# Altium footprint library 封装库.PcbLib: 755 footprints (part 34 of 48)
Each footprint in its own frame and in the unit in brackets; x right, y up, seen from the top. Pads: shape width x height; smd on the part's side, far side on the other; paste and mask are expansions set on the pad; w line width, h text height; cw(c..) or ccw(c..) is an arc to the next point about the centre after c.
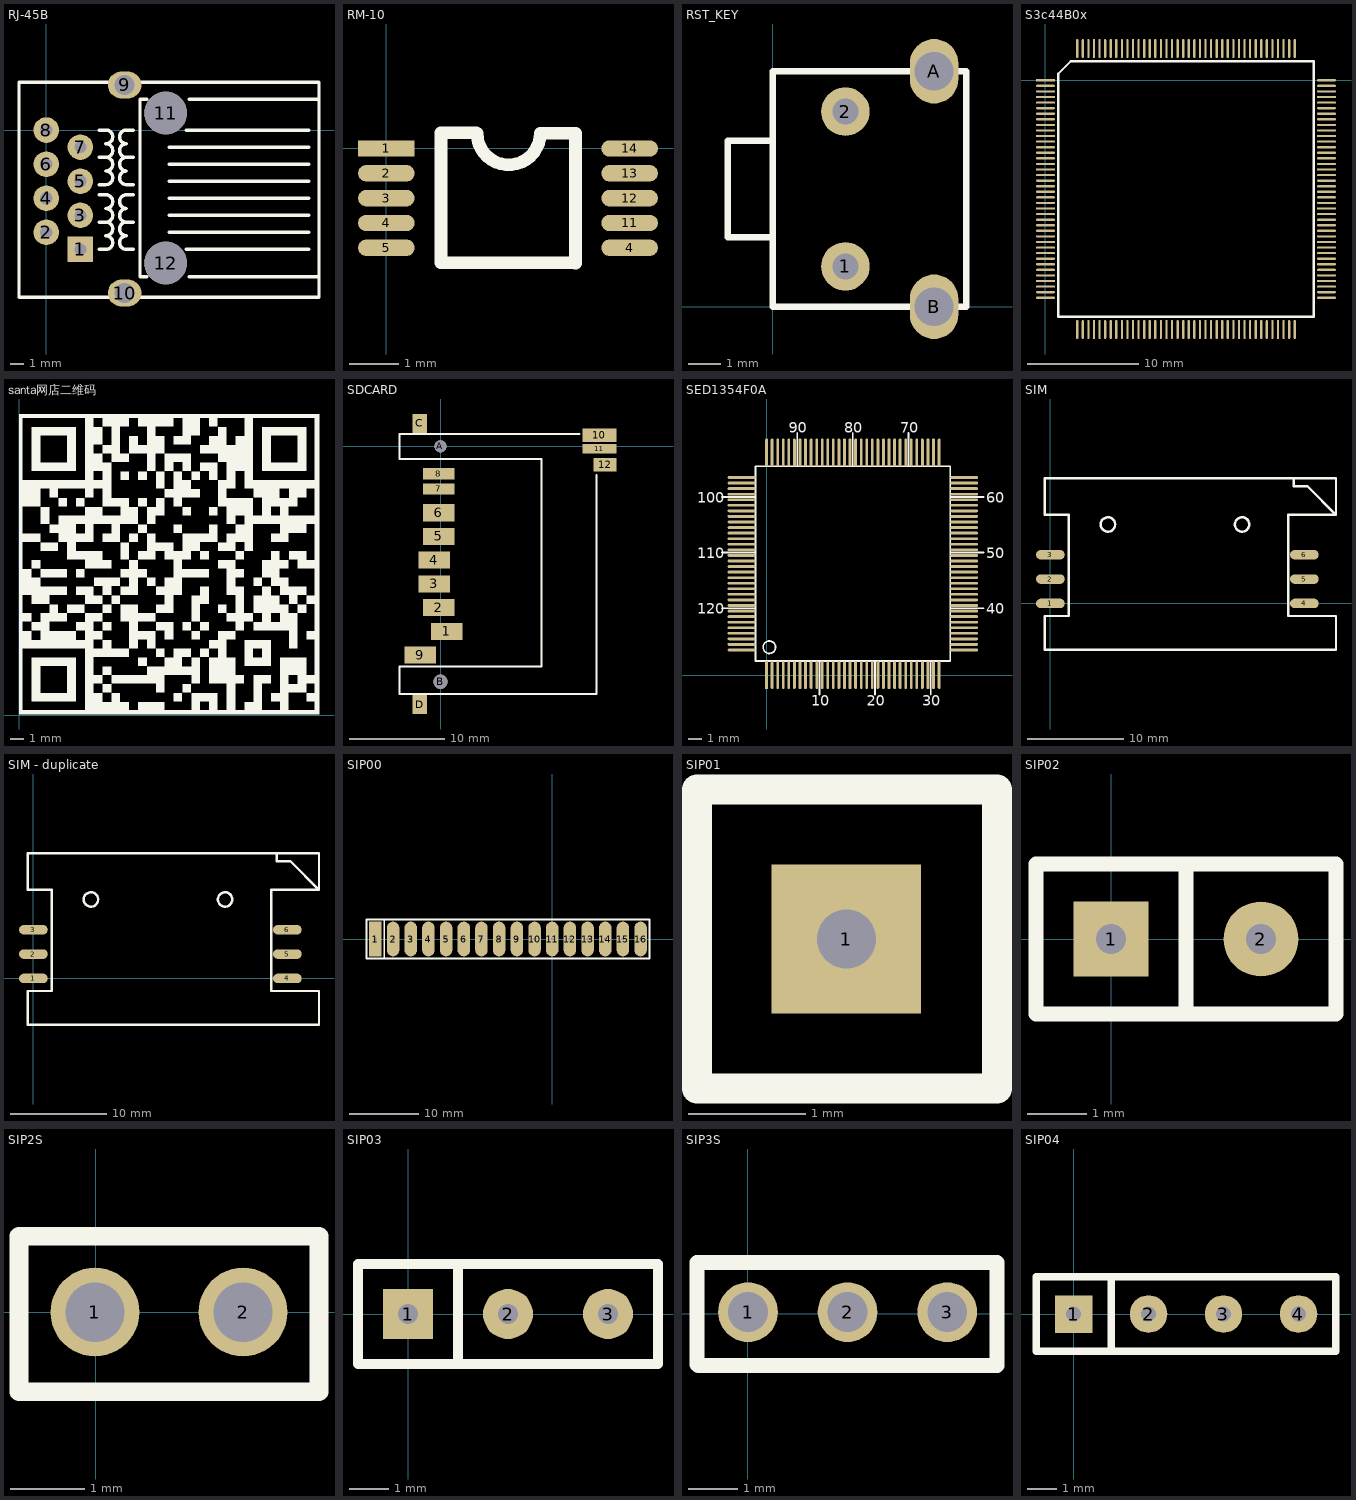
[diagram p33: the footprints below, top view; thin cyan lines are the x and y axes]

## RJ-45B [mm]
pads (12):
  rect 1.905x1.905 hole 0.9: 1(2.54,-8.89)
  round 1.905 hole 0.9: 2(0,-7.62) 3(2.54,-6.35) 4(0,-5.08) 5(2.54,-3.81) 6(0,-2.54) 7(2.54,-1.27) 8(0,0)
  oval 2.5x2 hole 1.5: 9(5.84,3.36) 10(5.84,-12.14)
  round 3.175 hole 3.175: 11(8.89,1.27) 12(8.89,-9.906)
Top Overlay:
  lines w0.254: 3.937,-8.89 4.445,-8.89 ccw(c4.445,-8.382) 4.445,-7.874 ccw(c4.445,-7.366) 4.445,-6.858 ; 3.937,-6.858 4.445,-6.858 ; 3.937,-4.826 4.445,-4.826 cw(c4.445,-5.334) 4.445,-5.842 cw(c4.445,-6.35) 4.445,-6.858 ; 3.937,-4.064 4.445,-4.064 ccw(c4.445,-3.556) 4.445,-3.048 ccw(c4.445,-2.54) 4.445,-2.032 ; 3.937,-2.032 4.445,-2.032 ; 3.937,0 4.445,0 cw(c4.445,-0.508) 4.445,-1.016 cw(c4.445,-1.524) 4.445,-2.032 ; 6.477,-8.89 5.969,-8.89 cw(c5.969,-8.382) 5.969,-7.874 cw(c5.969,-7.366) 5.969,-6.858 ; 6.477,-6.858 5.969,-6.858 ; 6.477,-4.826 5.969,-4.826 ccw(c5.969,-5.334) 5.969,-5.842 ccw(c5.969,-6.35) 5.969,-6.858 ; 6.477,-4.064 5.969,-4.064 cw(c5.969,-3.556) 5.969,-3.048 cw(c5.969,-2.54) 5.969,-2.032 ; 6.477,-2.032 5.969,-2.032 ; 6.477,0 5.969,0 ccw(c5.969,-0.508) 5.969,-1.016 ccw(c5.969,-1.524) 5.969,-2.032 ; 7.493,-10.922 6.985,-10.922 6.985,2.286 7.493,2.286 ; 9.144,-7.62 19.558,-7.62 ; 9.144,-6.35 19.558,-6.35 ; 9.144,-5.08 19.558,-5.08 ; 9.144,-3.81 19.558,-3.81 ; 9.144,-2.54 19.558,-2.54 ; 9.144,-1.27 19.558,-1.27 ; 10.414,-8.89 13.716,-8.89 19.558,-8.89 ; 10.414,0 13.462,0 19.558,0 ; 10.668,-10.922 17.272,-10.922 20.32,-10.922 ; 10.668,2.286 17.272,2.286 20.32,2.286 ; -2.032,-12.446 -2.032,3.556 -1.524,3.556 17.272,3.556 20.32,3.556 20.32,-12.446 17.272,-12.446 -1.524,-12.446 -2.032,-12.446

## RM-10 [mm]
pads (10):
  rect 1.143x0.33 smd: 1(0,0)
  oval 1.143x0.33 smd: 2(0,-0.5) 3(0,-1) 4(0,-1.5) 4(4.9,-2) 5(0,-2) 11(4.9,-1.5) 12(4.9,-1) 13(4.9,-0.5) 14(4.9,0)
Top Overlay:
  lines w0.254: 1.814,0.32 1.1,0.32 1.1,-2.3 3.799,-2.3 ; 1.829,0.305 ccw(c2.464,0.305) 3.099,0.305 3.806,0.305 ; 3.81,-2.311 3.81,0.309

## RST_KEY [mm]
pads (4):
  round 1.5 hole 0.8: 1(2.25,1.25) 2(2.25,6.05)
  oval 1.5x2 hole 1.2: A(5,7.3) B(5,0)
Top Overlay:
  lines w0.2: 0,2.15 -1.4,2.15 -1.4,5.15 0,5.15 ; 0,0 6,0 6,7.3 0,7.3 0,0

## S3c44B0x [mm]
pads (160):
  rect 1.7x0.2 smd: 1(0,0)
  oval 1.7x0.2 smd: 2(0,-0.5) 3(0,-1) 4(0,-1.5) 5(0,-2) 6(0,-2.5) 7(0,-3) 8(0,-3.5) 9(0,-4) 10(0,-4.5) 11(0,-5) 12(0,-5.5) 13(0,-6) 14(0,-6.5) 15(0,-7) 16(0,-7.5) 17(0,-8) 18(0,-8.5) 19(0,-9) 20(0,-9.5) 21(0,-10) 22(0,-10.5) 23(0,-11) 24(0,-11.5) 25(0,-12) 26(0,-12.5) 27(0,-13) 28(0,-13.5) 29(0,-14) 30(0,-14.5) 31(0,-15) 32(0,-15.5) 33(0,-16) 34(0,-16.5) 35(0,-17) 36(0,-17.5) 37(0,-18) 38(0,-18.5) 39(0,-19) 40(0,-19.5) 81(25.2,-19.5) 82(25.2,-19) 83(25.2,-18.5) 84(25.2,-18) 85(25.2,-17.5) 86(25.2,-17) 87(25.2,-16.5) 88(25.2,-16) 89(25.2,-15.5) 90(25.2,-15) 91(25.2,-14.5) 92(25.2,-14) 93(25.2,-13.5) 94(25.2,-13) 95(25.2,-12.5) 96(25.2,-12) 97(25.2,-11.5) 98(25.2,-11) 99(25.2,-10.5) 100(25.2,-10) 101(25.2,-9.5) 102(25.2,-9) 103(25.2,-8.5) 104(25.2,-8) 105(25.2,-7.5) 106(25.2,-7) 107(25.2,-6.5) 108(25.2,-6) 109(25.2,-5.5) 110(25.2,-5) 111(25.2,-4.5) 112(25.2,-4) 113(25.2,-3.5) 114(25.2,-3) 115(25.2,-2.5) 116(25.2,-2) 117(25.2,-1.5) 118(25.2,-1) 119(25.2,-0.5) 120(25.2,0)
  oval 0.2x1.7 smd: 41(2.85,-22.35) 42(3.35,-22.35) 43(3.85,-22.35) 44(4.35,-22.35) 45(4.85,-22.35) 46(5.35,-22.35) 47(5.85,-22.35) 48(6.35,-22.35) 49(6.85,-22.35) 50(7.35,-22.35) 51(7.85,-22.35) 52(8.35,-22.35) 53(8.85,-22.35) 54(9.35,-22.35) 55(9.85,-22.35) 56(10.35,-22.35) 57(10.85,-22.35) 58(11.35,-22.35) 59(11.85,-22.35) 60(12.35,-22.35) 61(12.85,-22.35) 62(13.35,-22.35) 63(13.85,-22.35) 64(14.35,-22.35) 65(14.85,-22.35) 66(15.35,-22.35) 67(15.85,-22.35) 68(16.35,-22.35) 69(16.85,-22.35) 70(17.35,-22.35) 71(17.85,-22.35) 72(18.35,-22.35) 73(18.85,-22.35) 74(19.35,-22.35) 75(19.85,-22.35) 76(20.35,-22.35) 77(20.85,-22.35) 78(21.35,-22.35) 79(21.85,-22.35) 80(22.35,-22.35) 121(22.35,2.85) 122(21.85,2.85) 123(21.35,2.85) 124(20.85,2.85) 125(20.35,2.85) 126(19.85,2.85) 127(19.35,2.85) 128(18.85,2.85) 129(18.35,2.85) 130(17.85,2.85) 131(17.35,2.85) 132(16.85,2.85) 133(16.35,2.85) 134(15.85,2.85) 135(15.35,2.85) 136(14.85,2.85) 137(14.35,2.85) 138(13.85,2.85) 139(13.35,2.85) 140(12.85,2.85) 141(12.35,2.85) 142(11.85,2.85) 143(11.35,2.85) 144(10.85,2.85) 145(10.35,2.85) 146(9.85,2.85) 147(9.35,2.85) 148(8.85,2.85) 149(8.35,2.85) 150(7.85,2.85) 151(7.35,2.85) 152(6.85,2.85) 153(6.35,2.85) 154(5.85,2.85) 155(5.35,2.85) 156(4.85,2.85) 157(4.35,2.85) 158(3.85,2.85) 159(3.35,2.85) 160(2.85,2.85)
Top Overlay:
  lines w0.2: 1.135,-21.215 24.065,-21.215 24.065,1.715 2.27,1.715 1.135,0.58 1.135,-21.215

## santa网店二维码 [mm] "santa2013.taobao.com"
Top Overlay:
  drawing of 4059 lines, arcs and shapes, not listed

## SDCARD [mm]
pads (16):
  rect 3.32x1.8 smd: 1(0.655,-19.487) 2(-0.175,-16.987) 3(-0.645,-14.487) 4(-0.645,-11.987) 5(-0.175,-9.487) 6(-0.175,-6.987) 9(-2.145,-21.987)
  rect 3.32x1.2 smd: 7(-0.175,-4.487) 8(-0.175,-2.862)
  rect 3.6x1.4 smd: 10(16.73,1.163)
  rect 3.6x1 smd: 11(16.73,-0.237)
  rect 2.4x1.4 smd: 12(17.32,-1.937)
  round 1.27 hole 1.27: A(-0.01,0.013)
  round 1.5 hole 1.5: B(-0.01,-24.787)
  rect 1.5x2 smd: C(-2.205,2.413) D(-2.205,-27.187)
Top Overlay:
  lines w0.204: -4.33,1.288 -4.33,-1.307 10.62,-1.307 10.62,-23.187 -4.33,-23.187 -4.33,-26.087 16.42,-26.087 16.42,-2.987 ; -4.33,1.313 14.62,1.313

## SED1354F0A [mm]
pads (128):
  rect 0.2x2 smd: 1(0,0)
  oval 0.2x2 smd: 2(0.4,0) 3(0.8,0) 4(1.2,0) 5(1.6,0) 6(2,0) 7(2.4,0) 8(2.8,0) 9(3.2,0) 10(3.6,0) 11(4,0) 12(4.4,0) 13(4.8,0) 14(5.2,0) 15(5.6,0) 16(6,0) 17(6.4,0) 18(6.8,0) 19(7.2,0) 20(7.6,0) 21(8,0) 22(8.4,0) 23(8.8,0) 24(9.2,0) 25(9.6,0) 26(10,0) 27(10.4,0) 28(10.8,0) 29(11.2,0) 30(11.6,0) 31(12,0) 32(12.4,0) 65(12.4,16) 66(12,16) 67(11.6,16) 68(11.2,16) 69(10.8,16) 70(10.4,16) 71(10,16) 72(9.6,16) 73(9.2,16) 74(8.8,16) 75(8.4,16) 76(8,16) 77(7.6,16) 78(7.2,16) 79(6.8,16) 80(6.4,16) 81(6,16) 82(5.6,16) 83(5.2,16) 84(4.8,16) 85(4.4,16) 86(4,16) 87(3.6,16) 88(3.2,16) 89(2.8,16) 90(2.4,16) 91(2,16) 92(1.6,16) 93(1.2,16) 94(0.8,16) 95(0.4,16) 96(0,16)
  oval 2x0.2 smd: 33(14.2,1.8) 34(14.2,2.2) 35(14.2,2.6) 36(14.2,3) 37(14.2,3.4) 38(14.2,3.8) 39(14.2,4.2) 40(14.2,4.6) 41(14.2,5) 42(14.2,5.4) 43(14.2,5.8) 44(14.2,6.2) 45(14.2,6.6) 46(14.2,7) 47(14.2,7.4) 48(14.2,7.8) 49(14.2,8.2) 50(14.2,8.6) 51(14.2,9) 52(14.2,9.4) 53(14.2,9.8) 54(14.2,10.2) 55(14.2,10.6) 56(14.2,11) 57(14.2,11.4) 58(14.2,11.8) 59(14.2,12.2) 60(14.2,12.6) 61(14.2,13) 62(14.2,13.4) 63(14.2,13.8) 64(14.2,14.2) 97(-1.8,14.2) 98(-1.8,13.8) 99(-1.8,13.4) 100(-1.8,13) 101(-1.8,12.6) 102(-1.8,12.2) 103(-1.8,11.8) 104(-1.8,11.4) 105(-1.8,11) 106(-1.8,10.6) 107(-1.8,10.2) 108(-1.8,9.8) 109(-1.8,9.4) 110(-1.8,9) 111(-1.8,8.6) 112(-1.8,8.2) 113(-1.8,7.8) 114(-1.8,7.4) 115(-1.8,7) 116(-1.8,6.6) 117(-1.8,6.2) 118(-1.8,5.8) 119(-1.8,5.4) 120(-1.8,5) 121(-1.8,4.6) 122(-1.8,4.2) 123(-1.8,3.8) 124(-1.8,3.4) 125(-1.8,3) 126(-1.8,2.6) 127(-1.8,2.2) 128(-1.8,1.8)
Top Overlay:
  circle w0.127: c0.2,2 r0.447
  lines w0.127: -3.2,4.8 -0.8,4.8 ; -3.2,8.8 -0.8,8.8 ; -3.2,12.8 -0.8,12.8 ; 2.2,15 2.2,17.4 ; 3.8,-1.4 3.8,1 ; 6.2,15 6.2,17.4 ; 7.8,-1.4 7.8,1 ; 10.2,15 10.2,17.4 ; 11.8,-1.4 11.8,1 ; 13.2,4.8 15.6,4.8 ; 13.2,8.8 15.6,8.8 ; 13.2,12.8 15.6,12.8 ; -0.8,1 13.2,1 13.2,15 -0.8,15 -0.8,1
  text "10" at 3.2,-2.2 h0.76
  text "20" at 7.2,-2.2 h0.76
  text "30" at 11.2,-2.2 h0.76
  text "40" at 15.8,4.4 h0.76
  text "50" at 15.8,8.4 h0.76
  text "60" at 15.8,12.4 h0.76
  text "70" at 9.6,17.4 h0.76
  text "80" at 5.6,17.4 h0.76
  text "90" at 1.6,17.4 h0.76
  text "100" at -5,12.4 h0.76
  text "110" at -5,8.4 h0.76
  text "120" at -5,4.4 h0.76

## SIM [mm] "SOT223, 4-Leads, Body 6.50x7.00mm (avg), Pitch 2.30mm, IPC Medium Density"
height 1.7
pads (6):
  oval 3x1 smd: 1(0,0) 2(0,2.54) 3(0,5.08) 4(26.5,0) 5(26.5,2.54) 6(26.5,5.08)
Top Overlay:
  circle w0.254: c6,8.24 r0.75
  circle w0.254: c20,8.24 r0.75
  lines w0.254: 25.4,13.04 25.4,12.24 26.8,12.24 29.8,9.24 ; 29.8,9.24 29.8,13.04 24.049,13.04 -0.6,13.04 -0.6,9.24 1.9,9.24 1.9,-1.31 -0.6,-1.31 -0.6,-4.81 29.8,-4.81 29.8,-1.31 24.8,-1.31 24.8,9.24 29.8,9.24

## SIM - duplicate [mm] "SOT223, 4-Leads, Body 6.50x7.00mm (avg), Pitch 2.30mm, IPC Medium Density"
height 1.7
pads (6):
  oval 3x1 smd: 1(0,0) 2(0,2.54) 3(0,5.08) 4(26.5,0) 5(26.5,2.54) 6(26.5,5.08)
Top Overlay:
  circle w0.254: c6,8.24 r0.75
  circle w0.254: c20,8.24 r0.75
  lines w0.254: 25.4,13.04 25.4,12.24 26.8,12.24 29.8,9.24 ; 29.8,9.24 29.8,13.04 24.049,13.04 -0.6,13.04 -0.6,9.24 1.9,9.24 1.9,-1.31 -0.6,-1.31 -0.6,-4.81 29.8,-4.81 29.8,-1.31 24.8,-1.31 24.8,9.24 29.8,9.24

## SIP00 [mm]
pads (16):
  rect 1.8x5 hole 0.5: 1(-25.4,0)
  oval 1.8x5 hole 0.5: 2(-22.86,0) 3(-20.32,0) 4(-17.78,0) 5(-15.24,0) 6(-12.7,0) 7(-10.16,0) 8(-7.62,0) 9(-5.08,0) 10(-2.54,0) 11(0,0) 12(2.54,0) 13(5.08,0) 14(7.62,0) 15(10.16,0) 16(12.7,0)
Top Overlay:
  lines w0.254: -24.13,-2.794 -24.13,2.794 ; -26.67,-2.794 13.97,-2.794 13.97,2.794 -26.67,2.794 -26.67,-2.794

## SIP01 [mm]
pads (1):
  rect 1.27x1.27 hole 0.5: 1(50.8,101.6)
Top Overlay:
  lines w0.254: 52.06,100.33 49.53,100.33 49.53,102.87 52.07,102.87 ; 52.08,100.33 52.08,102.87

## SIP02 [mm]
pads (2):
  rect 1.27x1.27 hole 0.5: 1(0,0)
  round 1.27 hole 0.5: 2(2.54,0)
Top Overlay:
  lines w0.254: 1.27,-1.27 1.27,1.27 ; -1.27,-1.27 -1.27,1.27 3.81,1.27 3.81,-1.27 -1.27,-1.27

## SIP2S [mm]
pads (2):
  round 1.2 hole 0.8: 1(-0.009,0.004) 2(1.991,0.004)
Top Overlay:
  lines w0.254: -1.034,1.029 -1.034,-1.071 3.016,-1.071 3.016,1.029 -1.034,1.029 ; -1.034,1.029 -1.034,1.029

## SIP03 [mm]
pads (3):
  rect 1.27x1.27 hole 0.5: 1(0,0)
  round 1.27 hole 0.5: 2(2.54,0) 3(5.08,0)
Top Overlay:
  lines w0.254: 1.27,-1.27 1.27,1.27 ; -1.27,-1.27 6.35,-1.27 6.35,1.27 -1.27,1.27 -1.27,-1.27

## SIP3S [mm]
pads (3):
  round 1.2 hole 0.8: 1(0.008,0.034) 2(2.008,0.034) 3(4.008,0.034)
Top Overlay:
  lines w0.305: -1.017,-1.016 -1.017,0.034 -1.017,1.034 5.008,1.034 5.008,-1.041 -0.992,-1.041 -1.017,-1.016

## SIP04 [mm]
pads (4):
  rect 1.27x1.27 hole 0.5: 1(0,0)
  round 1.27 hole 0.5: 2(2.54,0) 3(5.08,0) 4(7.62,0)
Top Overlay:
  lines w0.254: 1.27,-1.27 1.27,1.27 ; -1.27,-1.27 -1.27,1.27 8.89,1.27 8.89,-1.27 -1.27,-1.27